# Altium footprint library 常用元件封装库.PcbLib: 1310 footprints (part 6 of 83)
Each footprint in its own frame and in the unit in brackets; x right, y up, seen from the top. Pads: shape width x height; smd on the part's side, far side on the other; paste and mask are expansions set on the pad; w line width, h text height; cw(c..) or ccw(c..) is an arc to the next point about the centre after c.
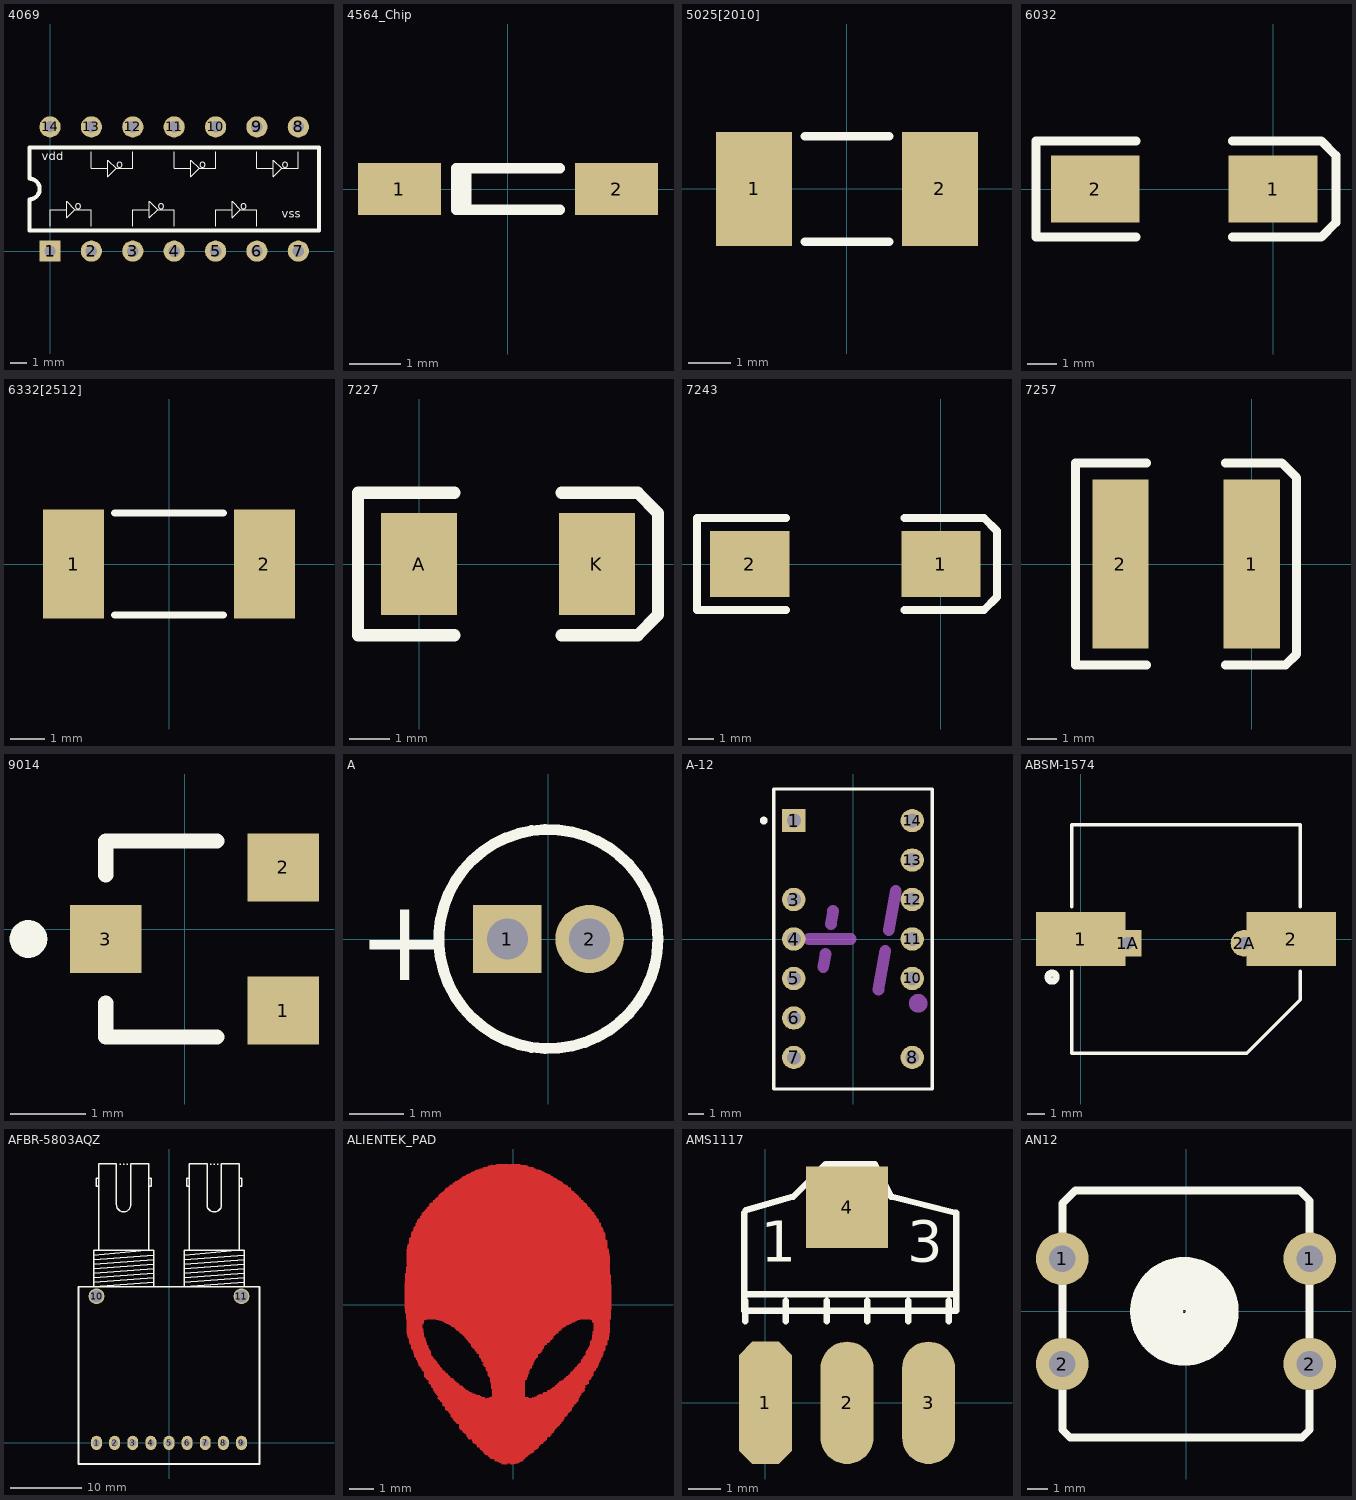
[diagram p5: the footprints below, top view; thin cyan lines are the x and y axes]

## 4069 [mm]
pads (14):
  rect 1.3x1.3 hole 0.7: 1(0,0)
  round 1.3 hole 0.7: 2(2.54,0) 3(5.08,0) 4(7.62,0) 5(10.16,0) 6(12.7,0) 7(15.24,0) 8(15.24,7.62) 9(12.7,7.62) 10(10.16,7.62) 11(7.62,7.62) 12(5.08,7.62) 13(2.54,7.62) 14(0,7.62)
Top Overlay:
  lines w0.051: 0,1.524 0,2.54 0.508,2.54 1.016,2.54 ; 2.54,1.524 2.54,2.54 1.524,2.54 ; 2.54,6.096 2.54,5.08 3.048,5.08 3.556,5.08 ; 5.08,1.524 5.08,2.54 5.588,2.54 6.096,2.54 ; 5.08,6.096 5.08,5.08 4.064,5.08 ; 7.62,1.524 7.62,2.54 6.604,2.54 ; 7.62,6.096 7.62,5.08 8.128,5.08 8.636,5.08 ; 10.16,1.524 10.16,2.54 10.668,2.54 11.176,2.54 ; 10.16,6.096 10.16,5.08 9.144,5.08 ; 12.7,1.524 12.7,2.54 11.684,2.54 ; 12.7,6.096 12.7,5.08 13.208,5.08 13.716,5.08 ; 15.24,6.096 15.24,5.08 14.224,5.08 ; 1.524,2.54 1.016,2.032 1.016,3.048 1.524,2.54 ; 4.064,5.08 3.556,4.572 3.556,5.588 4.064,5.08 ; 6.604,2.54 6.096,2.032 6.096,3.048 6.604,2.54 ; 9.144,5.08 8.636,4.572 8.636,5.588 9.144,5.08 ; 11.684,2.54 11.176,2.032 11.176,3.048 11.684,2.54 ; 14.224,5.08 13.716,4.572 13.716,5.588 14.224,5.08
  lines w0.254: -1.27,1.27 16.51,1.27 16.51,6.35 -1.27,6.35 -1.27,4.445 cw(c-1.27,3.81) -1.27,3.175 -1.27,1.27
  text "vss" at 14.224,2.032 h0.51
  text "vdd" at -0.508,5.588 h0.51
  text "o" at 4.064,5.08 h0.51
  text "o" at 9.144,5.08 h0.51
  text "o" at 14.224,5.08 h0.51
  text "o" at 11.684,2.54 h0.51
  text "o" at 6.604,2.54 h0.51
  text "o" at 1.524,2.54 h0.51

## 4564_Chip [mm] "4564 Chip; Chip Inductor; Body 4.5 x 6.4 mm (LxW typ)"
height 0.55
pads (2):
  rect 1.6x1 smd: 1(-2.1,0) 2(2.1,0)
Top Overlay:
  lines w0.2: -0.81,-0.4 -0.81,0.4 ; 1,-0.4 -1,-0.4 -1,0.4 1,0.4

## 5025[2010] [mm] "Chip Resistor; Body 5.0 x 2.5 mm (LxW typ)"
height 0.6
pads (2):
  rect 1.8x2.7 smd: 1(-2.2,0) 2(2.2,0)
Top Overlay:
  lines w0.2: -1,-1.25 1,-1.25 ; -1,1.25 1,1.25

## 6032 [mil]
pads (2):
  rect 120x90 smd: 1(0,0) 2(-240,0)
Top Overlay:
  lines w12: -185,-65 -320,-65 -320,65 -185,65 ; -55,-65 65,-65 85,-45 85,45 65,65 -55,65

## 6332[2512] [mm] "Chip Resistor; Body 6.3 x 3.2 mm (LxW typ)"
height 0.6
pads (2):
  rect 1.8x3.2 smd: 1(-2.8,0) 2(2.8,0)
Top Overlay:
  lines w0.2: -1.6,-1.5 1.6,-1.5 ; -1.6,1.5 1.6,1.5

## 7227 [mil]
pads (2):
  rect 75x100 smd: A(0,0) K(175,0)
Top Overlay:
  lines w12: 35,-70 -60,-70 -60,70 35,70 ; 140,-70 215,-70 235,-50 235,50 215,70 140,70

## 7243 [mil]
pads (2):
  rect 120x100 smd: 1(0,0) 2(-290,0)
Top Overlay:
  lines w12: -235,-70 -370,-70 -370,70 -235,70 ; -55,-70 65,-70 85,-50 85,50 65,70 -55,70

## 7257 [mil]
pads (2):
  rect 75x225 smd: 1(0,0) 2(-175,0)
Top Overlay:
  lines w12: -140,-135 -235,-135 -235,135 -140,135 ; -35,-135 45,-135 60,-120 60,115 40,135 -35,135

## 9014 [mm]
pads (3):
  rect 0.95x0.9 smd: 1(1.302,-1.077) 2(1.302,0.823) 3(-1.048,-0.127)
Top Overlay:
  circle w0.25: c-2.073,-0.127 r0.125
  lines w0.2: -1.048,-0.977 -1.048,-1.427 0.427,-1.427 ; -1.048,0.723 -1.048,1.173 0.427,1.173

## A [mm] "Capacitor, Electrolytic, Radial; Body 4 x 5 mm (Dia.xH typ); Pin Spacing 1.5 mm (typ)"
pads (2):
  rect 1.25x1.25 hole 0.75: 1(-0.75,0)
  round 1.25 hole 0.75: 2(0.75,0)
Top Overlay:
  circle w0.2: c0,0 r2
  text "+" at -3.475,-0.75 h1.5

## A-12 [mm] "LED, Universal ? Overflow, 7.62 mm, RHD; 14 Leads (2 Absent); Row Space 7.62 mm; Pitch 2.54 mm"
height 6.35
pads (12):
  rect 1.5x1.5 hole 0.9: 1(-3.81,7.62)
  round 1.5 hole 0.9: 3(-3.81,2.54) 4(-3.81,0) 5(-3.81,-2.54) 6(-3.81,-5.08) 7(-3.81,-7.62) 8(3.81,-7.62) 10(3.81,-2.54) 11(3.81,0) 12(3.81,2.54) 13(3.81,5.08) 14(3.81,7.62)
Top Overlay:
  circle w0.25: c-5.75,7.62 r0.125
  lines w0.2: -5.1,-9.65 -5.1,9.65 5.1,9.65 5.1,-9.65 -5.1,-9.65
Mechanical 1:
  circle w0.86: c4.19,-4.139 r0.17
  lines w0.762: -2.83,0 -0.17,0 ; -1.911,-1.799 -1.764,-0.962 ; -1.427,0.961 -1.28,1.8 ; 1.63,-3.262 2.071,-0.764 ; 2.303,0.565 2.747,3.084

## ABSM-1574 [mm] "Magnetic Transducer Buzzer"
pads (4):
  rect 5x3 smd: 1(0,0) 2(11.8,0)
  rect 1.5x1.5 hole 0.7: 1A(2.65,-0.24)
  round 1.5 hole 0.7: 2A(9.15,-0.24)
Top Overlay:
  circle w0.4: c-1.6,-2.134 r0.227
  lines w0.2: -0.5,-1.8 -0.5,-6.4 9.3,-6.4 12.3,-3.4 12.3,-1.8 ; -0.5,1.8 -0.5,6.4 12.3,6.4 12.3,1.8

## AFBR-5803AQZ [mm] "光以太网"
height 14.8
pads (11):
  oval 1.524x2 hole 1: 1(-10.16,0) 2(-7.62,0) 3(-5.08,0) 4(-2.54,0) 5(0,0) 6(2.54,0) 7(5.08,0) 8(7.62,0) 9(10.16,0)
  round 2.2 hole 1.8: 10(-10.16,20.54) 11(10.16,20.54)
Top Overlay:
  lines w0.2: -10.559,23.15 -2.159,23.785 ; -10.559,23.785 -2.159,24.42 ; -10.559,24.42 -2.159,25.055 ; -10.559,25.055 -2.159,25.69 ; -10.559,25.69 -2.159,26.325 ; -10.559,26.325 -3.184,26.98 ; -10.55,22.515 -2.159,23.15 ; -9.859,35.985 -10.225,35.985 -10.225,37.085 -9.859,37.085 ; -7.359,33.378 ccw(c-6.359,33.378) -5.359,33.385 -5.359,39.08 -2.859,39.08 -2.859,26.98 -9.859,26.98 -9.859,39.08 -7.359,39.08 -7.359,33.378 ; -6.923,39.047 -6.796,39.047 ; -6.415,39.047 -6.288,39.047 ; -5.907,39.047 -5.78,39.047 ; -2.859,35.985 -2.478,35.985 -2.478,37.085 -2.859,37.085 ; -2.168,22.515 -10.559,21.88 ; 2.141,23.15 10.541,23.785 ; 2.141,23.785 10.541,24.42 ; 2.141,24.42 10.541,25.055 ; 2.141,25.055 10.541,25.69 ; 2.141,25.69 10.541,26.325 ; 2.141,26.325 9.516,26.98 ; 2.15,22.515 10.541,23.15 ; 2.841,35.985 2.475,35.985 2.475,37.085 2.841,37.085 ; 5.341,33.378 ccw(c6.341,33.378) 7.341,33.385 7.341,39.08 9.841,39.08 9.841,26.98 2.841,26.98 2.841,39.08 5.341,39.08 5.341,33.378 ; 5.777,39.047 5.904,39.047 ; 6.285,39.047 6.412,39.047 ; 6.793,39.047 6.92,39.047 ; 9.841,35.985 10.222,35.985 10.222,37.085 9.841,37.085 ; 10.532,22.515 2.141,21.88 ; -10.559,21.88 -2.159,21.88 -2.159,26.98 -10.559,26.98 -10.559,21.88 ; 2.141,21.88 10.541,21.88 10.541,26.98 2.141,26.98 2.141,21.88
  lines w0.254: -12.7,-2.965 12.7,-2.965 ; -12.7,-2.92 -12.7,21.88 12.7,21.88 12.7,-2.92

## ALIENTEK_PAD [mil]
Top Layer:
  lines w1.03: -172.73,-4.76 156.18,-4.76 ; -172.73,-3.73 156.18,-3.73 ; -172.73,-2.7 156.18,-2.7 ; -172.73,-1.67 156.18,-1.67 ; -172.73,-0.64 156.18,-0.64 ; -172.73,0.39 156.18,0.39 ; -172.73,1.42 156.18,1.42 ; -172.73,2.45 156.18,2.45 ; -172.73,3.48 156.18,3.48 ; -172.73,4.51 156.18,4.51 ; -172.73,5.54 156.18,5.54 ; -172.73,6.57 156.18,6.57 ; -172.73,7.6 156.18,7.6 ; -172.73,8.63 156.18,8.63 ; -172.73,9.66 156.18,9.66 ; -172.73,10.69 156.18,10.69 ; -172.73,11.72 156.18,11.72 ; -172.73,12.75 156.18,12.75 ; -172.73,13.78 156.18,13.78 ; -172.73,14.81 156.18,14.81 ; -172.73,15.84 156.18,15.84 ; -172.73,16.87 156.18,16.87 ; -172.73,17.9 156.18,17.9 ; -172.73,18.93 156.18,18.93 ; -172.73,19.96 156.18,19.96 ; -172.73,20.99 156.18,20.99 ; -172.73,22.02 156.18,22.02 ; -172.73,23.05 156.18,23.05 ; -172.73,24.08 156.18,24.08 ; -172.73,25.11 156.18,25.11 ; -172.73,26.14 156.18,26.14 ; -172.73,27.17 156.18,27.17 ; -172.73,28.2 156.18,28.2 ; -172.73,29.23 156.18,29.23 ; -172.73,30.26 156.18,30.26 ; -172.73,31.29 156.18,31.29 ; -172.73,32.32 155.15,32.32 ; -172.73,33.35 155.15,33.35 ; -172.73,34.38 155.15,34.38 ; -171.7,-13 155.15,-13 ; -171.7,-11.97 155.15,-11.97 ; -171.7,-10.94 155.15,-10.94 ; -171.7,-9.91 155.15,-9.91 ; -171.7,-8.88 155.15,-8.88 ; -171.7,-7.85 156.18,-7.85 ; -171.7,-6.82 156.18,-6.82 ; -171.7,-5.79 156.18,-5.79 ; -171.7,35.41 155.15,35.41 ; -171.7,36.44 155.15,36.44 ; -171.7,37.47 155.15,37.47 ; -171.7,38.5 155.15,38.5 ; -171.7,39.53 155.15,39.53 ; -171.7,40.56 155.15,40.56 ; -171.7,41.59 155.15,41.59 ; -171.7,42.62 155.15,42.62 ; -171.7,43.65 155.15,43.65 ; -171.7,44.68 155.15,44.68 ; -171.7,45.71 155.15,45.71 ; -171.7,46.74 155.15,46.74 ; -171.7,47.77 155.15,47.77 ; -171.7,48.8 154.12,48.8 ; -171.7,49.83 154.12,49.83 ; -170.67,-22.27 155.15,-22.27 ; -170.67,-21.24 155.15,-21.24 ; -170.67,-20.21 155.15,-20.21 ; -170.67,-19.18 155.15,-19.18 ; -170.67,-18.15 155.15,-18.15 ; -170.67,-17.12 155.15,-17.12 ; -170.67,-16.09 155.15,-16.09 ; -170.67,-15.06 155.15,-15.06 ; -170.67,-14.03 155.15,-14.03 ; -170.67,50.86 154.12,50.86 ; -170.67,51.89 154.12,51.89 ; -170.67,52.92 154.12,52.92 ; -170.67,53.95 154.12,53.95 ; -170.67,54.98 154.12,54.98 ; -170.67,56.01 154.12,56.01 ; -170.67,57.04 154.12,57.04 ; -170.67,58.07 154.12,58.07 ; -170.67,59.1 154.12,59.1 ; -170.67,60.13 154.12,60.13 ; -169.64,-44.93 -142.52,-44.93 ; -169.64,-43.9 -143.55,-43.9 ; -169.64,-42.87 -143.55,-42.87 ; -169.64,-41.84 -143.55,-41.84 ; -169.64,-40.81 -143.55,-40.81 ; -169.64,-39.78 -143.55,-39.78 ; -169.64,-38.75 -143.55,-38.75 ; -169.64,-37.72 -144.58,-37.72 ; -169.64,-36.69 -144.58,-36.69 ; -169.64,-35.66 -144.58,-35.66 ; -169.64,-34.63 -144.58,-34.63 ; -169.64,-33.6 -144.58,-33.6 ; -169.64,-32.57 -144.58,-32.57 ; -169.64,-31.54 -144.58,-31.54 ; -169.64,-30.51 -143.55,-30.51 ; -169.64,-29.48 -143.55,-29.48 ; -169.64,-28.45 -142.52,-28.45 ; -169.64,-27.42 -142.52,-27.42 ; -169.64,-26.39 -142.52,-26.39 ; -169.64,-25.36 -142.52,-25.36 ; -169.64,-24.33 -141.49,-24.33 ; -169.64,-23.3 -138.4,-23.3 ; -169.64,61.16 154.12,61.16 ; -169.64,64.25 154.12,64.25 ; -169.64,65.28 154.12,65.28 ; -169.64,66.31 154.12,66.31 ; -169.64,67.34 154.12,67.34 ; -169.64,68.37 154.12,68.37 ; -169.64,69.4 154.12,69.4 ; -169.64,70.43 154.12,70.43 ; -169.64,71.46 154.12,71.46 ; -169.64,72.49 154.12,72.49 ; -169.64,73.52 154.12,73.52 ; -169.64,74.55 154.12,74.55 ; -169.64,75.58 154.12,75.58 ; -169.64,76.61 154.12,76.61 ; -169.64,77.64 154.12,77.64 ; -169.64,78.67 153.09,78.67 ; -169.64,79.7 153.09,79.7 ; -169.64,80.73 153.09,80.73 ; -169.64,81.76 153.09,81.76 ; -169.64,82.79 152.06,82.79 ; -169.64,83.82 152.06,83.82 ; -169.64,84.85 152.06,84.85 ; -169.64,85.88 152.06,85.88 ; -169.64,86.91 152.06,86.91 ; -169.64,87.94 151.03,87.94 ; -168.61,-48.02 -142.52,-48.02 ; -168.61,-46.99 -142.52,-46.99 ; -168.61,-45.96 -142.52,-45.96 ; -168.61,62.19 153.09,62.19 ; -168.61,63.22 154.12,63.22 ; -168.61,88.97 151.03,88.97 ; -168.61,90 150,90 ; -168.61,91.03 150,91.03 ; -168.61,92.06 150,92.06 ; -168.61,93.09 150,93.09 ; -167.58,-52.14 -141.49,-52.14 ; -167.58,-51.11 -141.49,-51.11 ; -167.58,-50.08 -142.52,-50.08 ; -167.58,-49.05 -142.52,-49.05 ; -167.58,94.12 150,94.12 ; -167.58,95.15 150,95.15 ; -167.58,96.18 150,96.18 ; -166.55,-54.2 -140.46,-54.2 ; -166.55,-53.17 -140.46,-53.17 ; -166.55,97.21 150,97.21 ; -165.52,-60.38 -138.4,-60.38 ; -165.52,-59.35 -138.4,-59.35 ; -165.52,-58.32 -138.4,-58.32 ; -165.52,-57.29 -139.43,-57.29 ; -165.52,-56.26 -139.43,-56.26 ; -165.52,-55.23 -140.46,-55.23 ; -165.52,98.24 150,98.24 ; -165.52,99.27 150,99.27 ; -165.52,100.3 150,100.3 ; -165.52,101.33 150,101.33 ; -165.52,102.36 148.97,102.36 ; -165.52,103.39 147.94,103.39 ; -165.52,104.42 146.91,104.42 ; -165.52,105.45 146.91,105.45 ; -164.49,-62.44 -137.37,-62.44 ; -164.49,-61.41 -137.37,-61.41 ; -164.49,106.48 146.91,106.48 ; -163.46,-63.47 -137.37,-63.47 ; -163.46,107.51 146.91,107.51 ; -162.43,-69.65 -134.28,-69.65 ; -162.43,-68.62 -135.31,-68.62 ; -162.43,-67.59 -135.31,-67.59 ; -162.43,-66.56 -135.31,-66.56 ; -162.43,-65.53 -135.31,-65.53 ; -162.43,-64.5 -136.34,-64.5 ; -162.43,108.54 146.91,108.54 ; -162.43,109.57 146.91,109.57 ; -162.43,110.6 146.91,110.6 ; -162.43,111.63 146.91,111.63 ; -162.43,112.66 146.91,112.66 ; -162.43,113.69 145.88,113.69 ; -162.43,114.72 145.88,114.72 ; -161.4,-70.68 -134.28,-70.68 ; -161.4,115.75 144.85,115.75 ; -160.37,-72.74 -132.22,-72.74 ; -160.37,-71.71 -133.25,-71.71 ; -160.37,116.78 143.82,116.78 ; -159.34,-73.77 -132.22,-73.77 ; -159.34,117.81 143.82,117.81 ; -159.34,118.84 143.82,118.84 ; -158.31,-77.89 -131.19,-77.89 ; -158.31,-76.86 -132.22,-76.86 ; -158.31,-75.83 -131.19,-75.83 ; -158.31,-74.8 -131.19,-74.8 ; -158.31,119.87 143.82,119.87 ; -158.31,120.9 142.79,120.9 ; -158.31,121.93 142.79,121.93 ; -158.31,122.96 141.76,122.96 ; -157.28,-82.01 -129.13,-82.01 ; -157.28,-80.98 -130.16,-80.98 ; -157.28,-79.95 -130.16,-79.95 ; -157.28,-78.92 -131.19,-78.92 ; -157.28,123.99 140.73,123.99 ; -156.25,-83.04 -128.1,-83.04 ; -156.25,125.02 139.7,125.02 ; -155.22,-85.1 -127.07,-85.1 ; -155.22,-84.07 -128.1,-84.07 ; -155.22,126.05 139.7,126.05 ; -155.22,127.08 139.7,127.08 ; -155.22,128.11 139.7,128.11 ; -155.22,129.14 139.7,129.14 ; -154.19,-87.16 -126.04,-87.16 ; -154.19,-86.13 -126.04,-86.13 ; -154.19,130.17 138.67,130.17 ; -153.16,-90.25 -122.95,-90.25 ; -153.16,-89.22 -122.95,-89.22 ; -153.16,-88.19 -123.98,-88.19 ; -153.16,131.2 136.61,131.2 ; -153.16,132.23 136.61,132.23 ; -153.16,133.26 136.61,133.26 ; -153.16,134.29 136.61,134.29 ; -152.13,-91.28 -121.92,-91.28 ; -152.13,135.32 135.58,135.32 ; -151.1,-93.34 -120.89,-93.34 ; -151.1,-92.31 -120.89,-92.31 ; -151.1,136.35 135.58,136.35 ; -150.07,-96.43 -117.8,-96.43 ; -150.07,-95.4 -118.83,-95.4 ; -150.07,-94.37 -119.86,-94.37 ; -149.04,-97.46 -116.77,-97.46 ; -149.04,137.38 133.52,137.38 ; -148.01,-98.49 -116.77,-98.49 ; -148.01,138.41 132.49,138.41 ; -148.01,139.44 132.49,139.44 ; -148.01,140.47 132.49,140.47 ; -146.98,-100.55 -114.71,-100.55 ; -146.98,-99.52 -115.74,-99.52 ; -146.98,141.5 131.46,141.5 ; -145.95,-102.61 -112.65,-102.61 ; -145.95,-101.58 -113.68,-101.58 ; -145.95,142.53 130.43,142.53 ; -145.95,144.59 129.4,144.59 ; -145.95,145.62 129.4,145.62 ; -144.92,-104.67 -111.62,-104.67 ; -144.92,-103.64 -112.65,-103.64 ; -144.92,143.56 129.4,143.56 ; -143.89,-105.7 -109.56,-105.7 ; -143.89,146.65 128.37,146.65 ; -142.86,147.68 126.31,147.68 ; -141.83,-113.94 -101.32,-113.94 ; -141.83,-112.91 -102.35,-112.91 ; -141.83,-111.88 -104.41,-111.88 ; -141.83,-110.85 -104.41,-110.85 ; -141.83,-109.82 -105.44,-109.82 ; -141.83,-108.79 -107.5,-108.79 ; -141.83,-107.76 -108.53,-107.76 ; -141.83,-106.73 -108.53,-106.73 ; -141.83,148.71 126.31,148.71 ; -140.8,-114.97 -100.29,-114.97 ; -140.8,149.74 125.28,149.74 ; -139.77,-116 -100.29,-116 ; -139.77,150.77 124.25,150.77 ; -138.74,-117.03 -96.17,-117.03 ; -138.74,151.8 123.22,151.8 ; -137.71,-119.09 -95.14,-119.09 ; -137.71,-118.06 -95.14,-118.06 ; -137.71,152.83 122.19,152.83 ; -137.71,153.86 122.19,153.86 ; -136.68,154.89 121.16,154.89 ; -135.65,-120.12 -94.11,-120.12 ; -135.65,155.92 119.1,155.92 ; -134.62,-124.24 -88.96,-124.24 ; -134.62,-123.21 -91.02,-123.21 ; -134.62,-122.18 -92.05,-122.18 ; -134.62,-121.15 -93.08,-121.15 ; -134.62,156.95 119.1,156.95 ; -133.59,-125.27 -87.93,-125.27 ; -133.59,157.98 118.07,157.98 ; -133.59,159.01 117.04,159.01 ; -132.56,-126.3 -86.9,-126.3 ; -132.56,160.04 117.04,160.04 ; -132.56,161.07 116.01,161.07 ; -131.53,-127.33 -85.87,-127.33 ; -130.5,-130.42 -80.72,-130.42 ; -130.5,-129.39 -81.75,-129.39 ; -130.5,-128.36 -84.84,-128.36 ; -130.5,162.1 113.95,162.1 ; -129.47,-131.45 -79.69,-131.45 ; -128.44,-132.48 -78.66,-132.48 ; -128.44,163.13 112.92,163.13 ; -127.41,-135.57 -75.57,-135.57 ; -127.41,-134.54 -76.6,-134.54 ; -127.41,-133.51 -77.63,-133.51 ; -127.41,164.16 111.89,164.16 ; -127.41,165.19 111.89,165.19 ; -127.41,166.22 110.86,166.22 ; -126.38,-137.63 -71.45,-137.63 ; -126.38,-136.6 -72.48,-136.6 ; -125.35,-139.69 -67.33,-139.69 ; -125.35,-138.66 -69.39,-138.66 ; -125.35,167.25 108.8,167.25 ; -124.32,-140.72 -65.27,-140.72 ; -124.32,168.28 107.77,168.28 ; -123.29,169.31 107.77,169.31 ; -122.26,-142.78 -60.12,-142.78 ; -122.26,-141.75 -61.15,-141.75 ; -122.26,-23.3 105.71,-23.3 ; -122.26,170.34 106.74,170.34 ; -121.23,-144.84 -52.91,-144.84 ; -121.23,-143.81 -58.06,-143.81 ; -120.2,-148.96 -44.67,-148.96 ; -120.2,-147.93 -45.7,-147.93 ; -120.2,171.37 104.68,171.37 ; -119.17,-149.99 104.68,-149.99 ; -119.17,-146.9 -49.82,-146.9 ; -119.17,-145.87 -50.85,-145.87 ; -119.17,-24.33 102.62,-24.33 ; -119.17,172.4 104.68,172.4 ; -119.17,173.43 103.65,173.43 ; -118.14,-151.02 103.65,-151.02 ; -118.14,174.46 102.62,174.46 ; -118.14,175.49 101.59,175.49 ; -117.11,-152.05 103.65,-152.05 ; -116.08,-153.08 103.65,-153.08 ; -116.08,176.52 99.53,176.52 ; -115.05,-154.11 102.62,-154.11 ; -115.05,-25.36 101.59,-25.36 ; -115.05,177.55 98.5,177.55 ; -114.02,-155.14 101.59,-155.14 ; -114.02,178.58 97.47,178.58 ; -112.99,-159.26 96.44,-159.26 ; -112.99,-156.17 100.56,-156.17 ; -111.96,-160.29 96.44,-160.29 ; -111.96,-158.23 98.5,-158.23 ; -111.96,-157.2 99.53,-157.2 ; -111.96,-26.39 98.5,-26.39 ; -111.96,179.61 97.47,179.61 ; -110.93,-161.32 96.44,-161.32 ; -110.93,180.64 95.41,180.64 ; -109.9,-27.42 97.47,-27.42 ; -109.9,181.67 94.38,181.67 ; -108.87,-162.35 95.41,-162.35 ; -108.87,-28.45 94.38,-28.45 ; -108.87,182.7 92.32,182.7 ; -107.84,-166.47 93.35,-166.47 ; -107.84,-165.44 93.35,-165.44 ; -107.84,-164.41 93.35,-164.41 ; -107.84,-163.38 94.38,-163.38 ; -107.84,183.73 91.29,183.73 ; -107.84,184.76 91.29,184.76 ; -106.81,-167.5 92.32,-167.5 ; -106.81,-29.48 92.32,-29.48 ; -106.81,185.79 91.29,185.79 ; -105.78,-168.53 92.32,-168.53 ; -103.72,-169.56 91.29,-169.56 ; -103.72,-30.51 90.26,-30.51 ; -103.72,186.82 88.2,186.82 ; -102.69,-171.62 88.2,-171.62 ; -102.69,-170.59 90.26,-170.59 ; -102.69,187.85 87.17,187.85 ; -101.66,-172.65 87.17,-172.65 ; -101.66,-31.54 88.2,-31.54 ; -101.66,188.88 87.17,188.88 ; -100.63,-173.68 87.17,-173.68 ; -100.63,-32.57 86.14,-32.57 ; -100.63,189.91 85.11,189.91 ; -99.6,-177.8 83.05,-177.8 ; -99.6,-176.77 85.11,-176.77 ; -99.6,-175.74 86.14,-175.74 ; -99.6,-174.71 86.14,-174.71 ; -99.6,190.94 84.08,190.94 ; -98.57,-178.83 82.02,-178.83 ; -98.57,-33.6 84.08,-33.6 ; -97.54,-34.63 83.05,-34.63 ; -96.51,-180.89 80.99,-180.89 ; -96.51,-179.86 80.99,-179.86 ; -96.51,191.97 80.99,191.97 ; -96.51,193 79.96,193 ; -95.48,-182.95 79.96,-182.95 ; -95.48,-181.92 80.99,-181.92 ; -95.48,-35.66 80.99,-35.66 ; -95.48,194.03 78.93,194.03 ; -94.45,-183.98 79.96,-183.98 ; -93.42,-185.01 78.93,-185.01 ; -93.42,-36.69 78.93,-36.69 ; -93.42,195.06 -10,195.06 -9.7,195.06 77.9,195.06 ; -92.39,-186.04 77.9,-186.04 ; -92.39,-37.72 76.87,-37.72 ; -92.39,196.09 -10,196.09 -9.7,196.09 76.87,196.09 ; -91.36,-187.07 76.87,-187.07 ; -91.36,-38.75 76.87,-38.75 ; -90.33,-188.1 76.87,-188.1 ; -90.33,-39.78 76.87,-39.78 ; -89.3,-189.13 75.84,-189.13 ; -89.3,197.12 -10,197.12 -9.7,197.12 73.78,197.12 ; -88.27,-40.81 73.78,-40.81 ; -88.27,198.15 -10,198.15 -9.7,198.15 72.75,198.15 ; -87.24,-41.84 72.75,-41.84 ; -86.21,-196.34 68.63,-196.34 ; -86.21,-195.31 69.66,-195.31 ; -86.21,-194.28 70.69,-194.28 ; -86.21,-193.25 71.72,-193.25 ; -86.21,-191.19 73.78,-191.19 ; -86.21,-190.16 73.78,-190.16 ; -86.21,-42.87 71.72,-42.87 ; -86.21,199.18 -10,199.18 -9.7,199.18 70.69,199.18 ; -85.18,-197.37 67.6,-197.37 ; -85.18,-192.22 72.75,-192.22 ; -85.18,-44.93 71.72,-44.93 ; -85.18,-43.9 71.72,-43.9 ; -85.18,200.21 -10,200.21 -9.7,200.21 69.66,200.21 ; -84.15,-198.4 66.57,-198.4 ; -83.12,-45.96 68.63,-45.96 ; -83.12,201.24 -10,201.24 -9.7,201.24 67.6,201.24 ; -82.09,-199.43 66.57,-199.43 ; -82.09,202.27 -10,202.27 -9.7,202.27 65.54,202.27 ; -81.06,-200.46 65.54,-200.46 ; -81.06,-46.99 67.6,-46.99 ; -81.06,203.3 -10,203.3 -9.7,203.3 -7,203.3 63.48,203.3 ; -80.03,-202.52 64.51,-202.52 ; -80.03,-201.49 64.51,-201.49 ; -80.03,-48.02 66.57,-48.02 ; -79,-203.55 63.48,-203.55 ; -79,-49.05 65.54,-49.05 ; -79,204.33 -10,204.33 -9.7,204.33 -7,204.33 62.45,204.33 ; -77.97,-204.58 62.45,-204.58 ; -77.97,-50.08 64.51,-50.08 ; -76.94,-52.14 63.48,-52.14 ; -76.94,-51.11 63.48,-51.11 ; -76.94,205.36 -10,205.36 -9.7,205.36 -7,205.36 60.39,205.36 ; -75.91,-205.61 60.39,-205.61 ; -75.91,-53.17 63.48,-53.17 ; -74.88,-206.64 59.36,-206.64 ; -74.88,-54.2 62.45,-54.2 ; -74.88,206.39 -10,206.39 -9.7,206.39 -7,206.39 59.36,206.39 ; -73.85,-209.73 58.33,-209.73 ; -73.85,-208.7 59.36,-208.7 ; -73.85,-207.67 60.39,-207.67 ; -73.85,-55.23 61.42,-55.23 ; -72.82,-210.76 55.24,-210.76 ; -72.82,-56.26 59.36,-56.26 ; -72.82,207.42 -10,207.42 -9.7,207.42 -7,207.42 57.3,207.42 ; -71.79,-212.82 53.18,-212.82 ; -71.79,-211.79 53.18,-211.79 ; -71.79,-58.32 58.33,-58.32 ; -71.79,-57.29 59.36,-57.29 ; -70.76,-213.85 53.18,-213.85 ; -70.76,-59.35 57.3,-59.35 ; -70.76,208.45 -10,208.45 -9.7,208.45 -7,208.45 54.21,208.45 ; -69.73,-60.38 56.27,-60.38 ; -68.7,-61.41 53.18,-61.41 ; -68.7,209.48 -10,209.48 -9.7,209.48 -7,209.48 53.18,209.48 ; -67.67,-62.44 53.18,-62.44 ; -66.64,-66.56 49.06,-66.56 ; -66.64,-65.53 49.06,-65.53 ; -66.64,-64.5 50.09,-64.5 ; -66.64,-63.47 53.18,-63.47 ; -66.64,210.51 -10,210.51 -9.7,210.51 -7,210.51 50.09,210.51 ; -65.61,-215.91 52.15,-215.91 ; -65.61,-214.88 53.18,-214.88 ; -65.61,-67.59 49.06,-67.59 ; -64.58,-219 48.03,-219 ; -64.58,-217.97 49.06,-217.97 ; -64.58,-216.94 51.12,-216.94 ; -64.58,-68.62 49.06,-68.62 ; -64.58,211.54 -10,211.54 -9.7,211.54 -7,211.54 49.06,211.54 ; -63.55,-220.03 48.03,-220.03 ; -62.52,-69.65 48.03,-69.65 ; -62.52,212.57 -10,212.57 -9.7,212.57 -7,212.57 45.97,212.57 ; -61.49,-221.06 47,-221.06 ; -61.49,-71.71 45.97,-71.71 ; -61.49,-70.68 47,-70.68 ; -60.46,-73.77 45.97,-73.77 ; -60.46,-72.74 45.97,-72.74 ; -60.46,213.6 -10,213.6 -9.7,213.6 -7,213.6 44.94,213.6 ; -59.43,-222.09 43.91,-222.09 ; -58.4,-224.15 41.85,-224.15 ; -58.4,-223.12 42.88,-223.12 ; -58.4,-76.86 42.88,-76.86 ; -58.4,-75.83 43.91,-75.83 ; -58.4,-74.8 44.94,-74.8 ; -58.4,214.63 -10,214.63 -9.7,214.63 -7,214.63 41.85,214.63 ; -57.37,-226.21 40.82,-226.21 ; -57.37,-225.18 40.82,-225.18 ; -57.37,-77.89 41.85,-77.89 ; -54.28,-83.04 38.76,-83.04 ; -54.28,-82.01 38.76,-82.01 ; -54.28,-80.98 38.76,-80.98 ; -54.28,-79.95 38.76,-79.95 ; -54.28,-78.92 38.76,-78.92 ; -54.28,215.66 -10,215.66 -9.7,215.66 -7,215.66 -6.37,215.66 35.67,215.66 ; -53.25,-229.3 38.76,-229.3 ; -53.25,-228.27 38.76,-228.27 ; -53.25,-227.24 39.79,-227.24 ; -53.25,-84.07 37.73,-84.07 ; -53.25,216.69 -10,216.69 -9.7,216.69 -7,216.69 -6.37,216.69 35.67,216.69 ; -52.22,-230.33 36.7,-230.33 ; -52.22,-85.1 36.7,-85.1 ; -51.19,-88.19 34.64,-88.19 ; -51.19,-87.16 34.64,-87.16 ; -51.19,-86.13 35.67,-86.13 ; -50.16,-231.36 34.64,-231.36 ; -50.16,-89.22 33.61,-89.22 ; -49.13,-232.39 32.58,-232.39 ; -49.13,-90.25 33.61,-90.25 ; -48.1,-233.42 32.58,-233.42 ; -48.1,-95.4 31.55,-95.4 ; -48.1,-94.37 31.55,-94.37 ; -48.1,-91.28 32.58,-91.28 ; -48.1,217.72 -10,217.72 -9.7,217.72 -7,217.72 -6.37,217.72 -4.64,217.72 32.58,217.72 ; -47.07,-235.48 31.55,-235.48 ; -47.07,-234.45 31.55,-234.45 ; -47.07,-97.46 29.49,-97.46 ; -47.07,-96.43 30.52,-96.43 ; -47.07,-93.34 31.55,-93.34 ; -47.07,-92.31 31.55,-92.31 ; -47.07,218.75 -10,218.75 -9.7,218.75 -7,218.75 -6.37,218.75 -4.64,218.75 31.55,218.75 ; -46.04,-236.51 28.46,-236.51 ; -45.01,-237.54 26.4,-237.54 ; -45.01,-98.49 29.49,-98.49 ; -43.98,-238.57 25.37,-238.57 ; -43.98,-102.61 26.4,-102.61 ; -43.98,-101.58 27.43,-101.58 ; -43.98,-100.55 29.49,-100.55 ; -43.98,-99.52 29.49,-99.52 ; -42.95,-104.67 25.37,-104.67 ; -42.95,-103.64 26.4,-103.64 ; -41.92,-239.6 24.34,-239.6 ; -41.92,-148.96 104.68,-148.96 ; -41.92,-105.7 25.37,-105.7 ; -41.92,219.78 -10,219.78 -9.7,219.78 -7,219.78 -6.37,219.78 -4.64,219.78 10,219.78 25.37,219.78 ; -40.89,-111.88 23.31,-111.88 ; -40.89,-110.85 24.34,-110.85 ; -40.89,-109.82 24.34,-109.82 ; -40.89,-107.76 25.37,-107.76 ; -40.89,-106.73 24.34,-106.73 ; -39.86,-240.63 23.31,-240.63 ; -39.86,-112.91 23.31,-112.91 ; -39.86,-108.79 25.37,-108.79 ; -39.86,220.81 -10,220.81 -9.7,220.81 -7,220.81 -6.37,220.81 -5,220.81 ; -38.83,-241.66 21.25,-241.66 ; -38.83,-113.94 23.31,-113.94 ; -37.8,-242.69 20.22,-242.69 ; -37.8,-147.93 24.34,-147.93 ; -37.8,-114.97 22.28,-114.97 ; -36.77,-243.72 19.19,-243.72 ; -36.77,-122.18 18.16,-122.18 ; -36.77,-121.15 18.16,-121.15 ; -36.77,-120.12 19.19,-120.12 ; -36.77,-119.09 21.25,-119.09 ; -36.77,-118.06 21.25,-118.06 ; -36.77,-117.03 21.25,-117.03 ; -36.77,-116 21.25,-116 ; -35.74,-244.75 18.16,-244.75 ; -35.74,-124.24 18.16,-124.24 ; -35.74,-123.21 18.16,-123.21 ; -35.74,221.84 -10,221.84 -9.7,221.84 -7,221.84 -6.37,221.84 -5,221.84 -4.64,221.84 10,221.84 20.22,221.84 ; -34.71,-146.9 18.16,-146.9 ; -34.71,-133.51 18.16,-133.51 ; -34.71,-132.48 18.16,-132.48 ; -34.71,-131.45 18.16,-131.45 ; -34.71,-130.42 18.16,-130.42 ; -34.71,-129.39 18.16,-129.39 ; -34.71,-128.36 18.16,-128.36 ; -34.71,-127.33 18.16,-127.33 ; -34.71,-126.3 18.16,-126.3 ; -34.71,-125.27 18.16,-125.27 ; -34.71,222.87 -34.37,222.87 ; -33.68,-145.87 18.16,-145.87 ; -33.68,-144.84 18.16,-144.84 ; -33.68,-143.81 18.16,-143.81 ; -33.68,-142.78 18.16,-142.78 ; -33.68,-141.75 18.16,-141.75 ; -33.68,-140.72 18.16,-140.72 ; -33.68,-139.69 18.16,-139.69 ; -33.68,-138.66 18.16,-138.66 ; -33.68,-137.63 18.16,-137.63 ; -33.68,-136.6 18.16,-136.6 ; -33.68,-135.57 18.16,-135.57 ; -33.68,-134.54 18.16,-134.54 ; -30.59,-245.78 17.13,-245.78 ; -29.56,-247.84 16.1,-247.84 ; -29.56,-246.81 16.1,-246.81 ; -28.53,-248.87 14.04,-248.87 ; -27.5,222.87 -10,222.87 -9.7,222.87 -7,222.87 -6.37,222.87 -5,222.87 -4.64,222.87 10,222.87 10.95,222.87 ; -26.47,223.9 -20,223.9 -10,223.9 -9.7,223.9 -7,223.9 ; -24.41,-249.9 11.98,-249.9 ; -22.35,-250.93 9.92,-250.93 ; -19.26,-251.96 7.86,-251.96 ; -18.23,-254.02 -16.86,-254.02 ; -18.23,-252.99 -9.65,-252.99 ; -15.14,-254.02 -9.65,-254.02 ; -5,223.9 -4.64,223.9 10,223.9 10.95,223.9 ; -4.84,-254.02 0.65,-254.02 ; -4.84,-252.99 3.74,-252.99 ; -4.64,220.81 10,220.81 23.31,220.81 ; 30.18,-147.93 31.55,-147.93 ; 33.27,-147.93 104.68,-147.93 ; 34.3,-146.9 105.71,-146.9 ; 37.39,-145.87 105.71,-145.87 ; 38.42,-144.84 106.74,-144.84 ; 40.48,-143.81 107.77,-143.81 ; 42.54,-142.78 43.91,-142.78 ; 45.63,-142.78 108.8,-142.78 ; 46.66,-141.75 108.8,-141.75 ; 47.69,-140.72 108.8,-140.72 ; 48.72,-139.69 109.83,-139.69 ; 53.87,-138.66 111.89,-138.66 ; 53.87,-137.63 112.92,-137.63 ; 54.9,-136.6 113.95,-136.6 ; 57.99,-135.57 113.95,-135.57 ; 60.05,-134.54 112.92,-134.54 ; 62.11,-133.51 112.92,-133.51 ; 63.14,-132.48 113.95,-132.48 ; 63.14,-131.45 114.98,-131.45 ; 66.23,-130.42 114.98,-130.42 ; 67.26,-129.39 114.98,-129.39 ; 67.26,-128.36 114.98,-128.36 ; 69.32,-127.33 117.04,-127.33 ; 70.35,-126.3 119.1,-126.3 ; 71.38,-125.27 120.13,-125.27 ; 72.41,-124.24 120.13,-124.24 ; 73.44,-123.21 120.13,-123.21 ; 74.47,-122.18 120.13,-122.18 ; 76.53,-121.15 120.13,-121.15 ; 78.59,-120.12 121.16,-120.12 ; 81.68,-119.09 122.19,-119.09 ; 81.68,-118.06 123.22,-118.06 ; 81.68,-117.03 124.25,-117.03 ; 83.74,-116 124.25,-116 ; 84.77,-114.97 124.25,-114.97 ; 84.77,-113.94 126.31,-113.94 ; 87.86,-112.91 127.34,-112.91 ; 88.89,-111.88 127.34,-111.88 ; 89.92,-110.85 127.34,-110.85 ; 90.95,-109.82 127.34,-109.82 ; 90.95,-108.79 127.34,-108.79 ; 91.98,-107.76 127.34,-107.76 ; 91.98,-106.73 128.37,-106.73 ; 95.07,-105.7 129.4,-105.7 ; 95.07,-104.67 130.43,-104.67 ; 96.1,-103.64 131.46,-103.64 ; 97.13,-102.61 131.46,-102.61 ; 99.19,-101.58 132.49,-101.58 ; 99.19,-100.55 132.49,-100.55 ; 99.19,-99.52 133.52,-99.52 ; 101.25,-98.49 134.55,-98.49 ; 102.28,-97.46 134.55,-97.46 ; 102.28,-96.43 135.58,-96.43 ; 103.31,-95.4 135.58,-95.4 ; 104.34,-94.37 136.61,-94.37 ; 105.37,-93.34 136.61,-93.34 ; 107.43,-92.31 136.61,-92.31 ; 108.46,-91.28 137.64,-91.28 ; 108.46,-90.25 137.64,-90.25 ; 108.46,-89.22 138.67,-89.22 ; 108.46,-88.19 138.67,-88.19 ; 109.49,-87.16 139.7,-87.16 ; 110.52,-86.13 139.7,-86.13 ; 110.52,-85.1 139.7,-85.1 ; 111.55,-84.07 140.73,-84.07 ; 112.58,-83.04 141.76,-83.04 ; 112.58,-82.01 141.76,-82.01 ; 113.61,-80.98 142.79,-80.98 ; 115.67,-79.95 142.79,-79.95 ; 115.67,-78.92 143.82,-78.92 ; 115.67,-77.89 143.82,-77.89 ; 115.67,-76.86 143.82,-76.86 ; 115.67,-75.83 143.82,-75.83 ; 115.67,-74.8 143.82,-74.8 ; 116.7,-73.77 144.85,-73.77 ; 117.73,-72.74 145.88,-72.74 ; 118.76,-71.71 146.91,-71.71 ; 118.76,-70.68 146.91,-70.68 ; 119.79,-69.65 146.91,-69.65 ; 119.79,-68.62 146.91,-68.62 ; 120.82,-67.59 146.91,-67.59 ; 120.82,-66.56 146.91,-66.56 ; 121.85,-65.53 146.91,-65.53 ; 121.85,-64.5 147.94,-64.5 ; 122.88,-63.47 150,-63.47 ; 122.88,-62.44 150,-62.44 ; 122.88,-61.41 150,-61.41 ; 122.88,-60.38 150,-60.38 ; 122.88,-59.35 150,-59.35 ; 122.88,-58.32 150,-58.32 ; 123.91,-57.29 150,-57.29 ; 123.91,-23.3 154.12,-23.3 ; 124.94,-56.26 151.03,-56.26 ; 124.94,-55.23 152.06,-55.23 ; 124.94,-24.33 154.12,-24.33 ; 125.97,-54.2 152.06,-54.2 ; 125.97,-53.17 152.06,-53.17 ; 125.97,-51.11 152.06,-51.11 ; 125.97,-50.08 153.09,-50.08 ; 125.97,-49.05 153.09,-49.05 ; 125.97,-48.02 153.09,-48.02 ; 125.97,-26.39 154.12,-26.39 ; 125.97,-25.36 153.09,-25.36 ; 127,-52.14 152.06,-52.14 ; 127,-46.99 153.09,-46.99 ; 127,-45.96 153.09,-45.96 ; 127,-44.93 153.09,-44.93 ; 127,-43.9 154.12,-43.9 ; 127,-42.87 154.12,-42.87 ; 127,-28.45 154.12,-28.45 ; 127,-27.42 154.12,-27.42 ; 128.03,-41.84 154.12,-41.84 ; 128.03,-40.81 154.12,-40.81 ; 128.03,-39.78 154.12,-39.78 ; 128.03,-38.75 154.12,-38.75 ; 128.03,-37.72 154.12,-37.72 ; 128.03,-36.69 154.12,-36.69 ; 128.03,-35.66 154.12,-35.66 ; 128.03,-34.63 154.12,-34.63 ; 128.03,-33.6 154.12,-33.6 ; 128.03,-32.57 154.12,-32.57 ; 128.03,-31.54 154.12,-31.54 ; 128.03,-30.51 154.12,-30.51 ; 128.03,-29.48 154.12,-29.48

## AMS1117 [mil]
pads (4):
  oct 65x150 smd: 1(0.03,-0.06)
  oval 65x150 smd: 2(100.03,-0.06) 3(200.03,-0.06)
  rect 100x100 smd: 4(100.03,239.94)
Top Overlay:
  lines w7.87: -25.97,232.94 -25.97,132.94 ; -24.97,99.94 -24.97,124.94 ; -24.3,236.27 34.03,252.94 74.03,292.94 134.03,292.94 154.03,252.94 234.03,232.94 234.03,112.94 ; 25.03,99.94 25.03,124.94 ; 75.03,99.94 75.03,124.94 ; 125.03,99.94 125.03,124.94 ; 175.03,99.94 175.03,124.94 ; 225.03,99.94 225.03,124.94 ; -25.97,132.94 234.03,132.94 234.03,112.94 ; -25.97,132.94 -25.97,112.94 234.03,112.94
  text "3" at 174.03,172.94 h50
  text "1" at -5.97,172.94 h50
3D body "User Library-AMS1117-1.STEP": height 72.24, standoff -1.03, extent -27.04,-14.79 229.06,260.8

## AN12 [mil]
pads (4):
  round 100 hole 50: 1(-235,100) 1(235,100) 2(-235,-100) 2(235,-100)
Top Overlay:
  circle w100: c-3.15,0 r53.15
  lines w15: -235,-225 -235,205 -210,230 215,230 235,210 235,-225 220,-240 -220,-240 -235,-225